# Altium footprint library cool_library.PcbLib: 1182 footprints (part 68 of 75)
Each footprint in its own frame and in the unit in brackets; x right, y up, seen from the top. Pads: shape width x height; smd on the part's side, far side on the other; paste and mask are expansions set on the pad; w line width, h text height; cw(c..) or ccw(c..) is an arc to the next point about the centre after c.
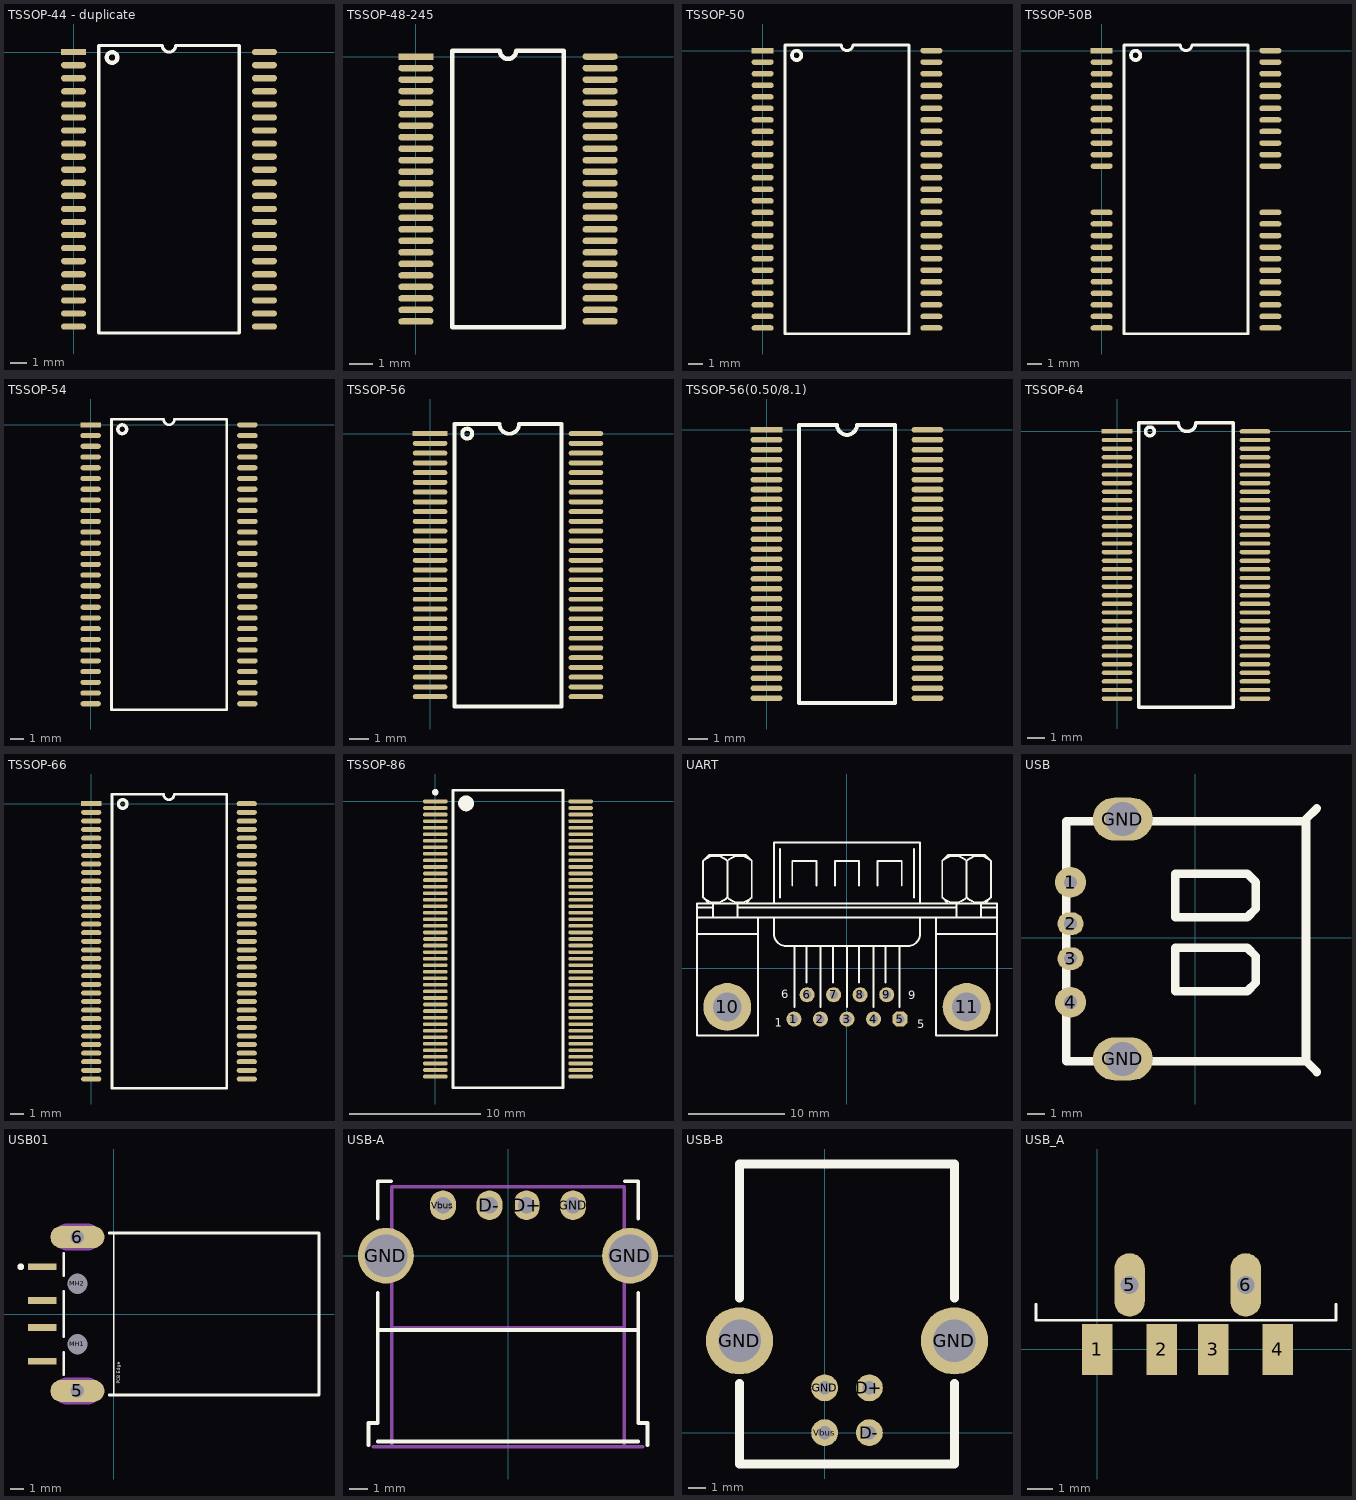
[diagram p67: the footprints below, top view; thin cyan lines are the x and y axes]

## TSSOP-44 - duplicate [mil]
pads (44):
  rect 60x15 smd: 1(0,0)
  oval 60x15 smd: 2(0,-31.5) 3(0,-62.99) 4(0,-94.49) 5(0,-125.98) 6(0,-157.48) 7(0,-188.98) 8(0,-220.47) 9(0,-251.97) 10(0,-283.46) 11(0,-314.96) 12(0,-346.46) 13(0,-377.95) 14(0,-409.45) 15(0,-440.95) 16(0,-472.44) 17(0,-503.94) 18(0,-535.43) 19(0,-566.93) 20(0,-598.43) 21(0,-629.92) 22(0,-661.42) 23(459.99,-661.42) 24(459.99,-629.92) 25(459.99,-598.43) 26(459.99,-566.93) 27(459.99,-535.43) 28(459.99,-503.94) 29(459.99,-472.44) 30(459.99,-440.95) 31(459.99,-409.45) 32(459.99,-377.95) 33(459.99,-346.46) 34(459.99,-314.96) 35(459.99,-283.46) 36(459.99,-251.97) 37(459.99,-220.47) 38(459.99,-188.98) 39(459.99,-157.48) 40(459.99,-125.98) 41(459.99,-94.49) 42(459.99,-62.99) 43(459.99,-31.5) 44(459.99,0)
Top Overlay:
  circle w10: c92.79,-13 r12.81
  lines w7.87: 61,-677.17 61,15.75 214.27,15.75 ccw(c230.09,15.75) 245.91,15.75 399.19,15.75 399.19,-677.17 61,-677.17

## TSSOP-48-245 [mil]
pads (48):
  rect 60x11 smd: 1(0,0)
  oval 60x11 smd: 2(0,-19.68) 3(0,-39.37) 4(0,-59.06) 5(0,-78.74) 6(0,-98.42) 7(0,-118.11) 8(0,-137.79) 9(0,-157.48) 10(0,-177.16) 11(0,-196.85) 12(0,-216.53) 13(0,-236.22) 14(0,-255.91) 15(0,-275.59) 16(0,-295.27) 17(0,-314.96) 18(0,-334.64) 19(0,-354.33) 20(0,-374.01) 21(0,-393.7) 22(0,-413.38) 23(0,-433.07) 24(0,-452.76) 25(314.96,-452.75) 26(314.96,-433.07) 27(314.96,-413.38) 28(314.96,-393.7) 29(314.96,-374.01) 30(314.96,-354.33) 31(314.96,-334.64) 32(314.96,-314.96) 33(314.96,-295.27) 34(314.96,-275.59) 35(314.96,-255.91) 36(314.96,-236.22) 37(314.96,-216.53) 38(314.96,-196.85) 39(314.96,-177.16) 40(314.96,-157.48) 41(314.96,-137.79) 42(314.96,-118.11) 43(314.96,-98.42) 44(314.96,-78.74) 45(314.96,-59.05) 46(314.96,-39.37) 47(314.96,-19.68) 48(314.96,0)
Top Overlay:
  lines w7.87: 62.4,-462.6 62.4,9.84 143.63,9.84 ccw(c157.48,9.84) 171.33,9.84 252.56,9.84 252.56,-462.6 62.4,-462.6

## TSSOP-50 [mil]
pads (50):
  rect 60x15 smd: 1(0,0)
  oval 60x15 smd: 2(0,-31.5) 3(0,-62.99) 4(0,-94.49) 5(0,-125.98) 6(0,-157.48) 7(0,-188.98) 8(0,-220.47) 9(0,-251.97) 10(0,-283.46) 11(0,-314.96) 12(0,-346.46) 13(0,-377.95) 14(0,-409.45) 15(0,-440.95) 16(0,-472.44) 17(0,-503.94) 18(0,-535.43) 19(0,-566.93) 20(0,-598.43) 21(0,-629.92) 22(0,-661.42) 23(0,-692.91) 24(0,-724.41) 25(0,-755.91) 26(459.99,-755.91) 27(459.99,-724.41) 28(459.99,-692.91) 29(459.99,-661.42) 30(459.99,-629.92) 31(459.99,-598.43) 32(459.99,-566.93) 33(459.99,-535.43) 34(459.99,-503.94) 35(459.99,-472.44) 36(459.99,-440.95) 37(459.99,-409.45) 38(459.99,-377.95) 39(459.99,-346.46) 40(459.99,-314.96) 41(459.99,-283.46) 42(459.99,-251.97) 43(459.99,-220.47) 44(459.99,-188.98) 45(459.99,-157.48) 46(459.99,-125.98) 47(459.99,-94.49) 48(459.99,-62.99) 49(459.99,-31.5) 50(459.99,0)
Top Overlay:
  circle w10: c92.79,-13 r12.81
  lines w7.87: 61,-771.65 61,15.75 214.27,15.75 ccw(c230.09,15.75) 245.91,15.75 399.19,15.75 399.19,-771.65 61,-771.65

## TSSOP-50B [mil]
pads (44):
  rect 60x15 smd: 1(0,0)
  oval 60x15 smd: 2(0,-31.5) 3(0,-62.99) 4(0,-94.49) 5(0,-125.98) 6(0,-157.48) 7(0,-188.98) 8(0,-220.47) 9(0,-251.97) 10(0,-283.46) 11(0,-314.96) 15(0,-440.95) 16(0,-472.44) 17(0,-503.94) 18(0,-535.43) 19(0,-566.93) 20(0,-598.43) 21(0,-629.92) 22(0,-661.42) 23(0,-692.91) 24(0,-724.41) 25(0,-755.91) 26(459.99,-755.91) 27(459.99,-724.41) 28(459.99,-692.91) 29(459.99,-661.42) 30(459.99,-629.92) 31(459.99,-598.43) 32(459.99,-566.93) 33(459.99,-535.43) 34(459.99,-503.94) 35(459.99,-472.44) 36(459.99,-440.95) 40(459.99,-314.96) 41(459.99,-283.46) 42(459.99,-251.97) 43(459.99,-220.47) 44(459.99,-188.98) 45(459.99,-157.48) 46(459.99,-125.98) 47(459.99,-94.49) 48(459.99,-62.99) 49(459.99,-31.5) 50(459.99,0)
Top Overlay:
  circle w10: c92.79,-13 r12.81
  lines w7.87: 61,-771.65 61,15.75 214.27,15.75 ccw(c230.09,15.75) 245.91,15.75 399.19,15.75 399.19,-771.65 61,-771.65

## TSSOP-54 [mil]
pads (54):
  rect 60x15 smd: 1(0,0)
  oval 60x15 smd: 2(0,-31.5) 3(0,-62.99) 4(0,-94.49) 5(0,-125.98) 6(0,-157.48) 7(0,-188.98) 8(0,-220.47) 9(0,-251.97) 10(0,-283.46) 11(0,-314.96) 12(0,-346.46) 13(0,-377.95) 14(0,-409.45) 15(0,-440.95) 16(0,-472.44) 17(0,-503.94) 18(0,-535.43) 19(0,-566.93) 20(0,-598.43) 21(0,-629.92) 22(0,-661.42) 23(0,-692.91) 24(0,-724.41) 25(0,-755.91) 26(0,-787.4) 27(0,-818.9) 28(459.99,-818.9) 29(459.99,-787.4) 30(459.99,-755.91) 31(459.99,-724.41) 32(459.99,-692.91) 33(459.99,-661.42) 34(459.99,-629.92) 35(459.99,-598.43) 36(459.99,-566.93) 37(459.99,-535.43) 38(459.99,-503.94) 39(459.99,-472.44) 40(459.99,-440.95) 41(459.99,-409.45) 42(459.99,-377.95) 43(459.99,-346.46) 44(459.99,-314.96) 45(459.99,-283.46) 46(459.99,-251.97) 47(459.99,-220.47) 48(459.99,-188.98) 49(459.99,-157.48) 50(459.99,-125.98) 51(459.99,-94.49) 52(459.99,-62.99) 53(459.99,-31.5) 54(459.99,0)
Top Overlay:
  circle w10: c92.79,-13 r12.81
  lines w7.87: 61,-836 61,16 214.27,16 ccw(c230.09,16) 245.91,16 400,16 400,-836 61,-836

## TSSOP-56 [mil]
pads (56):
  rect 70x10 smd: 1(0,0)
  oval 70x10 smd: 2(0,-19.69) 3(0,-39.37) 4(0,-59.06) 5(0,-78.74) 6(0,-98.43) 7(0,-118.11) 8(0,-137.8) 9(0,-157.48) 10(0,-177.17) 11(0,-196.85) 12(0,-216.54) 13(0,-236.22) 14(0,-255.91) 15(0,-275.59) 16(0,-295.28) 17(0,-314.96) 18(0,-334.65) 19(0,-354.33) 20(0,-374.02) 21(0,-393.7) 22(0,-413.39) 23(0,-433.07) 24(0,-452.76) 25(0,-472.44) 26(0,-492.13) 27(0,-511.81) 28(0,-531.5) 29(314.96,-531.5) 30(314.96,-511.81) 31(314.96,-492.13) 32(314.96,-472.44) 33(314.96,-452.76) 34(314.96,-433.07) 35(314.96,-413.39) 36(314.96,-393.7) 37(314.96,-374.02) 38(314.96,-354.33) 39(314.96,-334.65) 40(314.96,-314.96) 41(314.96,-295.28) 42(314.96,-275.59) 43(314.96,-255.91) 44(314.96,-236.22) 45(314.96,-216.54) 46(314.96,-196.85) 47(314.96,-177.17) 48(314.96,-157.48) 49(314.96,-137.8) 50(314.96,-118.11) 51(314.96,-98.43) 52(314.96,-78.74) 53(314.96,-59.06) 54(314.96,-39.37) 55(314.96,-19.69) 56(314.96,0)
Top Overlay:
  circle w8: c75,0 r10
  lines w8: 49.21,-551.18 49.21,19.68 140,19.68 ccw(c160,19.68) 180,19.68 265.75,19.68 265.75,-551.18 49.21,-551.18

## TSSOP-56(0.50/8.1) [mm]
pads (56):
  rect 1.6x0.28 smd: 1(0,0)
  oval 1.6x0.28 smd: 2(0,-0.5) 3(0,-1) 4(0,-1.5) 5(0,-2) 6(0,-2.5) 7(0,-3) 8(0,-3.5) 9(0,-4) 10(0,-4.5) 11(0,-5) 12(0,-5.5) 13(0,-6) 14(0,-6.5) 15(0,-7) 16(0,-7.5) 17(0,-8) 18(0,-8.5) 19(0,-9) 20(0,-9.5) 21(0,-10) 22(0,-10.5) 23(0,-11) 24(0,-11.5) 25(0,-12) 26(0,-12.5) 27(0,-13) 28(0,-13.5) 29(8.1,-13.5) 30(8.1,-13) 31(8.1,-12.5) 32(8.1,-12) 33(8.1,-11.5) 34(8.1,-11) 35(8.1,-10.5) 36(8.1,-10) 37(8.1,-9.5) 38(8.1,-9) 39(8.1,-8.5) 40(8.1,-8) 41(8.1,-7.5) 42(8.1,-7) 43(8.1,-6.5) 44(8.1,-6) 45(8.1,-5.5) 46(8.1,-5) 47(8.1,-4.5) 48(8.1,-4) 49(8.1,-3.5) 50(8.1,-3) 51(8.1,-2.5) 52(8.1,-2) 53(8.1,-1.5) 54(8.1,-1) 55(8.1,-0.5) 56(8.1,0)
Top Overlay:
  lines w0.2: 1.635,-13.75 6.465,-13.75 6.465,0.25 4.55,0.25 cw(c4.05,0.25) 3.55,0.25 1.635,0.25 1.635,-13.75

## TSSOP-64 [mil]
pads (64):
  rect 70x10 smd: 1(0,0)
  oval 70x10 smd: 2(0,-19.69) 3(0,-39.37) 4(0,-59.06) 5(0,-78.74) 6(0,-98.43) 7(0,-118.11) 8(0,-137.8) 9(0,-157.48) 10(0,-177.17) 11(0,-196.85) 12(0,-216.54) 13(0,-236.22) 14(0,-255.91) 15(0,-275.59) 16(0,-295.28) 17(0,-314.96) 18(0,-334.65) 19(0,-354.33) 20(0,-374.02) 21(0,-393.7) 22(0,-413.39) 23(0,-433.07) 24(0,-452.76) 25(0,-472.44) 26(0,-492.13) 27(0,-511.81) 28(0,-531.5) 29(0,-551.18) 30(0,-570.87) 31(0,-590.55) 32(0,-610.24) 33(314.96,-610.24) 34(314.96,-590.55) 35(314.96,-570.87) 36(314.96,-551.18) 37(314.96,-531.5) 38(314.96,-511.81) 39(314.96,-492.13) 40(314.96,-472.44) 41(314.96,-452.76) 42(314.96,-433.07) 43(314.96,-413.39) 44(314.96,-393.7) 45(314.96,-374.02) 46(314.96,-354.33) 47(314.96,-334.65) 48(314.96,-314.96) 49(314.96,-295.28) 50(314.96,-275.59) 51(314.96,-255.91) 52(314.96,-236.22) 53(314.96,-216.54) 54(314.96,-196.85) 55(314.96,-177.17) 56(314.96,-157.48) 57(314.96,-137.79) 58(314.96,-118.11) 59(314.96,-98.42) 60(314.96,-78.74) 61(314.96,-59.05) 62(314.96,-39.37) 63(314.96,-19.68) 64(314.96,0)
Top Overlay:
  circle w8: c75,0 r10
  lines w8: 49.21,-629.92 49.21,19.68 140,19.68 ccw(c160,19.68) 180,19.68 265.75,19.68 265.75,-629.92 49.21,-629.92

## TSSOP-66 [mil]
pads (66):
  rect 60x15 smd: 1(0,0)
  oval 60x15 smd: 2(0,-25.59) 3(0,-51.18) 4(0,-76.77) 5(0,-102.36) 6(0,-127.95) 7(0,-153.54) 8(0,-179.13) 9(0,-204.72) 10(0,-230.31) 11(0,-255.91) 12(0,-281.5) 13(0,-307.09) 14(0,-332.68) 15(0,-358.27) 16(0,-383.86) 17(0,-409.45) 18(0,-435.04) 19(0,-460.63) 20(0,-486.22) 21(0,-511.81) 22(0,-537.4) 23(0,-562.99) 24(0,-588.58) 25(0,-614.17) 26(0,-639.76) 27(0,-665.35) 28(0,-690.94) 29(0,-716.54) 30(0,-742.13) 31(0,-767.72) 32(0,-793.31) 33(0,-818.9) 34(463,-818.9) 35(463,-793.31) 36(463,-767.72) 37(463,-742.13) 38(463,-716.54) 39(463,-690.94) 40(463,-665.35) 41(463,-639.76) 42(463,-614.17) 43(463,-588.58) 44(463,-562.99) 45(463,-537.4) 46(463,-511.81) 47(463,-486.22) 48(463,-460.63) 49(463,-435.04) 50(463,-409.45) 51(463,-383.86) 52(463,-358.27) 53(463,-332.68) 54(463,-307.09) 55(463,-281.5) 56(463,-255.91) 57(463,-230.31) 58(463,-204.72) 59(463,-179.13) 60(463,-153.54) 61(463,-127.95) 62(463,-102.36) 63(463,-76.77) 64(463,-51.18) 65(463,-25.59) 66(463,0)
Top Overlay:
  circle w10: c93.79,-0.75 r12.81
  lines w7.87: 246.91,28 cw(c231.09,28) 215.27,28 62,28 62,-846.8 400.19,-846.8 ; 249.73,28 403,28 403,-846.8

## TSSOP-86 [mm]
pads (86):
  oval 1.9x0.279 smd: 1(0,0) 2(0,-0.5) 3(0,-1) 4(0,-1.5) 5(0,-2) 6(0,-2.5) 7(0,-3) 8(0,-3.5) 9(0,-4) 10(0,-4.5) 11(0,-5) 12(0,-5.5) 13(0,-6) 14(0,-6.5) 15(0,-7) 16(0,-7.5) 17(0,-8) 18(0,-8.5) 19(0,-9) 20(0,-9.5) 21(0,-10) 22(0,-10.5) 23(0,-11) 24(0,-11.5) 25(0,-12) 26(0,-12.5) 27(0,-13) 28(0,-13.5) 29(0,-14) 30(0,-14.5) 31(0,-15) 32(0,-15.5) 33(0,-16) 34(0,-16.5) 35(0,-17) 36(0,-17.5) 37(0,-18) 38(0,-18.5) 39(0,-19) 40(0,-19.5) 41(0,-20) 42(0,-20.5) 43(0,-21) 44(11.1,-21) 45(11.1,-20.5) 46(11.1,-20) 47(11.1,-19.5) 48(11.1,-19) 49(11.1,-18.5) 50(11.1,-18) 51(11.1,-17.5) 52(11.1,-17) 53(11.1,-16.5) 54(11.1,-16) 55(11.1,-15.5) 56(11.1,-15) 57(11.1,-14.5) 58(11.1,-14) 59(11.1,-13.5) 60(11.1,-13) 61(11.1,-12.5) 62(11.1,-12) 63(11.1,-11.5) 64(11.1,-11) 65(11.1,-10.5) 66(11.1,-10) 67(11.1,-9.5) 68(11.1,-9) 69(11.1,-8.5) 70(11.1,-8) 71(11.1,-7.5) 72(11.1,-7) 73(11.1,-6.5) 74(11.1,-6) 75(11.1,-5.5) 76(11.1,-5) 77(11.1,-4.5) 78(11.1,-4) 79(11.1,-3.5) 80(11.1,-3) 81(11.1,-2.5) 82(11.1,-2) 83(11.1,-1.5) 84(11.1,-1) 85(11.1,-0.5) 86(11.1,0)
Top Overlay:
  circle w0.6: c2.35,-0.15 r0.3
  circle w0.25: c0,0.7 r0.125
  lines w0.2: 1.35,-21.85 9.75,-21.85 9.75,0.85 1.35,0.85 1.35,-21.85

## UART [mil]
pads (11):
  round 62 hole 35: 1(-218.28,-209.25) 2(-109.11,-209.25) 3(0.05,-209.25) 4(109.22,-209.25) 6(-164.11,-109.25) 7(-54.95,-109.25) 8(54.22,-109.25) 9(163.39,-109.25)
  oct 62x62 hole 35: 5(218.39,-209.25)
  round 196.67 hole 118.33: 10(-492.45,-159.25) 11(491.72,-159.25)
Top Overlay:
  lines w8: -616.61,140.75 -366.61,140.75 ; -616.61,207.41 616.72,207.41 ; -616.61,249.08 -549.95,249.08 ; -591.7,290.66 ccw(c-541.61,340.75) -491.53,290.66 ; -591.7,440.83 cw(c-541.61,390.75) -491.53,440.83 ; -566.61,265.75 -591.61,290.75 -591.61,440.75 -566.61,465.75 -416.61,465.75 -391.61,440.75 -391.61,290.75 -416.61,265.75 ; -549.95,207.41 -549.95,265.75 ; -491.7,290.66 ccw(c-441.61,340.75) -391.53,290.66 ; -491.7,440.83 cw(c-441.61,390.75) -391.53,440.83 ; -491.61,290.75 -491.61,440.75 ; -449.95,207.41 -449.95,265.75 ; -449.95,249.08 450.05,249.08 ; -366.61,207.41 -366.61,-275.92 -616.61,-275.92 -616.61,265.75 616.72,265.75 616.72,-275.92 366.72,-275.92 366.72,207.41 ; -299.95,207.41 -299.95,140.75 ccw(c-249.95,140.75) -249.95,90.75 250.05,90.75 ccw(c250.05,140.75) 300.05,140.75 300.05,207.41 ; -299.95,265.75 -299.95,515.75 300.05,515.75 300.05,265.75 ; -274.95,290.75 -274.95,490.75 ; -224.95,340.75 -224.95,440.75 -124.95,440.75 -124.95,340.75 ; -216.61,-159.25 -216.61,90.75 ; -166.61,-59.25 -166.61,90.75 ; -108.28,-159.25 -108.28,90.75 ; -58.28,-59.25 -58.28,90.75 ; -49.95,340.75 -49.95,440.75 50.05,440.75 50.05,340.75 ; 0.05,-159.25 0.05,90.75 ; 50.05,-59.25 50.05,90.75 ; 108.39,-159.25 108.39,90.75 ; 125.05,340.75 125.05,440.75 225.05,440.75 225.05,340.75 ; 158.39,-59.25 158.39,90.75 ; 216.72,-159.25 216.72,90.75 ; 275.05,290.75 275.05,490.75 ; 366.72,140.75 616.72,140.75 ; 391.63,290.66 ccw(c441.72,340.75) 491.81,290.66 ; 391.63,440.83 cw(c441.72,390.75) 491.81,440.83 ; 416.72,265.75 391.72,290.75 391.72,440.75 416.72,465.75 566.72,465.75 591.72,440.75 591.72,290.75 566.72,265.75 ; 450.05,207.41 450.05,265.75 ; 491.63,290.66 ccw(c541.72,340.75) 591.81,290.66 ; 491.63,440.83 cw(c541.72,390.75) 591.81,440.83 ; 491.72,290.75 491.72,440.75 ; 550.05,207.41 550.05,265.75 ; 550.05,249.08 616.72,249.08
  text "1" at -296.18,-241.54 h35
  text "6" at -270.2,-124.61 h35
  text "5" at 289.25,-247.44 h35
  text "9" at 251.85,-127.76 h35

## USB [mm]
pads (6):
  round 1.8 hole 0.762: 1(-7.255,3.228) 4(-7.255,-3.757)
  oval 1.524x1.324 hole 0.762: 2(-7.255,0.815) 3(-7.255,-1.217)
  oval 3.5x2.5 hole 2: GND(-4.207,-7.059) GND(-4.207,6.911)
Top Overlay:
  lines w0.5: -7.509,-7.186 -7.509,6.784 6.461,6.784 ; -7.382,-7.186 6.461,-7.186 ; -1.159,-3.122 -1.159,-0.582 3.032,-0.582 3.54,-1.09 3.54,-1.217 ; -1.159,1.196 -1.159,3.736 3.032,3.736 3.54,3.228 3.54,3.101 ; -1.032,-3.122 3.032,-3.122 3.54,-2.614 3.54,-1.344 ; -1.032,1.196 3.032,1.196 3.54,1.704 3.54,2.974 ; 7.096,-7.821 6.461,-7.186 ; 7.096,7.546 6.461,6.911 6.461,6.784 ; 6.461,-7.186 6.461,6.784

## USB01 [mm] "Connector; USB1.1, Type A, SM; 4 Position; Right Angle"
height 4.5
pads (8):
  rect 2.1x0.5 smd: 1(-5.3,3.5) 2(-5.3,1) 3(-5.3,-1) 4(-5.3,-3.5)
  oval 4x1.65 hole 1: 5(-2.7,-5.7) 6(-2.7,5.7)
  round 1.2 hole 1.5 unplated: MH1(-2.7,-2.25) MH2(-2.7,2.25)
Top Overlay:
  circle w0.25: c-6.9,3.5 r0.125
  lines w0.1: 0,-6 0,6
  lines w0.2: -3.7,-4.475 -3.7,-2.83 ; -3.7,-1.68 -3.7,1.68 ; -3.7,2.83 -3.7,4.475 ; -0.33,-6 15.2,-6 15.2,6 -0.33,6
  text "PCB Edge" at 0.473,-5.173 h0.25
Mechanical 1:
  lines w1: -3.45,-5.7 -1.95,-5.7 ; -3.45,5.7 -1.95,5.7
Mechanical 2:
  lines w2.016: -3.45,-5.7 -1.95,-5.7 ; -3.45,5.7 -1.95,5.7

## USB-A [mm]
pads (6):
  oval 1.4x1.6 hole 0.9: D+(1,2.71) D-(-1,2.71) GND(3.5,2.71) Vbus(-3.5,2.71)
  round 3 hole 2.3: GND(-6.57,0) GND(6.57,0)
Top Overlay:
  lines w0.2: -7.5,-10.2 -7.5,-9 -7,-9 -7,-2 ; -7,-10 7,-10 ; -7,-4 7,-4 ; -7,2 -7,4 -6.3,4 ; 6.3,4 7,4 7,2 ; 7,-2 7,-9 7.5,-9 7.5,-10.2
Mechanical 1:
  lines w0.2: -7.25,-10.28 7.25,-10.28 ; -6.25,-10.28 -6.25,3.71 6.25,3.71 6.25,-10.28 ; -6.25,-3.88 6.25,-3.88

## USB-B [mil]
pads (6):
  round 60 hole 30: D+(100,100) D-(100,0) GND(0,100) Vbus(0,0)
  round 150 hole 95: GND(-190,205) GND(290,205)
Top Overlay:
  lines w19.68: -190,110 -190,-70 0,-70 290,-70 290,110 ; -190,300 -190,600 290,600 290,300

## USB_A [mm]
pads (6):
  rect 1.2x2 smd: 1(0,0) 2(2.54,0) 3(4.572,0) 4(7.112,0)
  oval 1.2x2.5 hole 0.7: 5(1.27,2.54) 6(5.842,2.54)
Top Overlay:
  lines w0.1: -2.413,1.778 -2.413,1.143 9.398,1.143 9.398,1.778